# Altium schematic symbol library LATTICEPLDS_Library.SchLib: 291 symbols (part 23 of 32) (continued)
## LFEC33-F484/FN484 (continued)
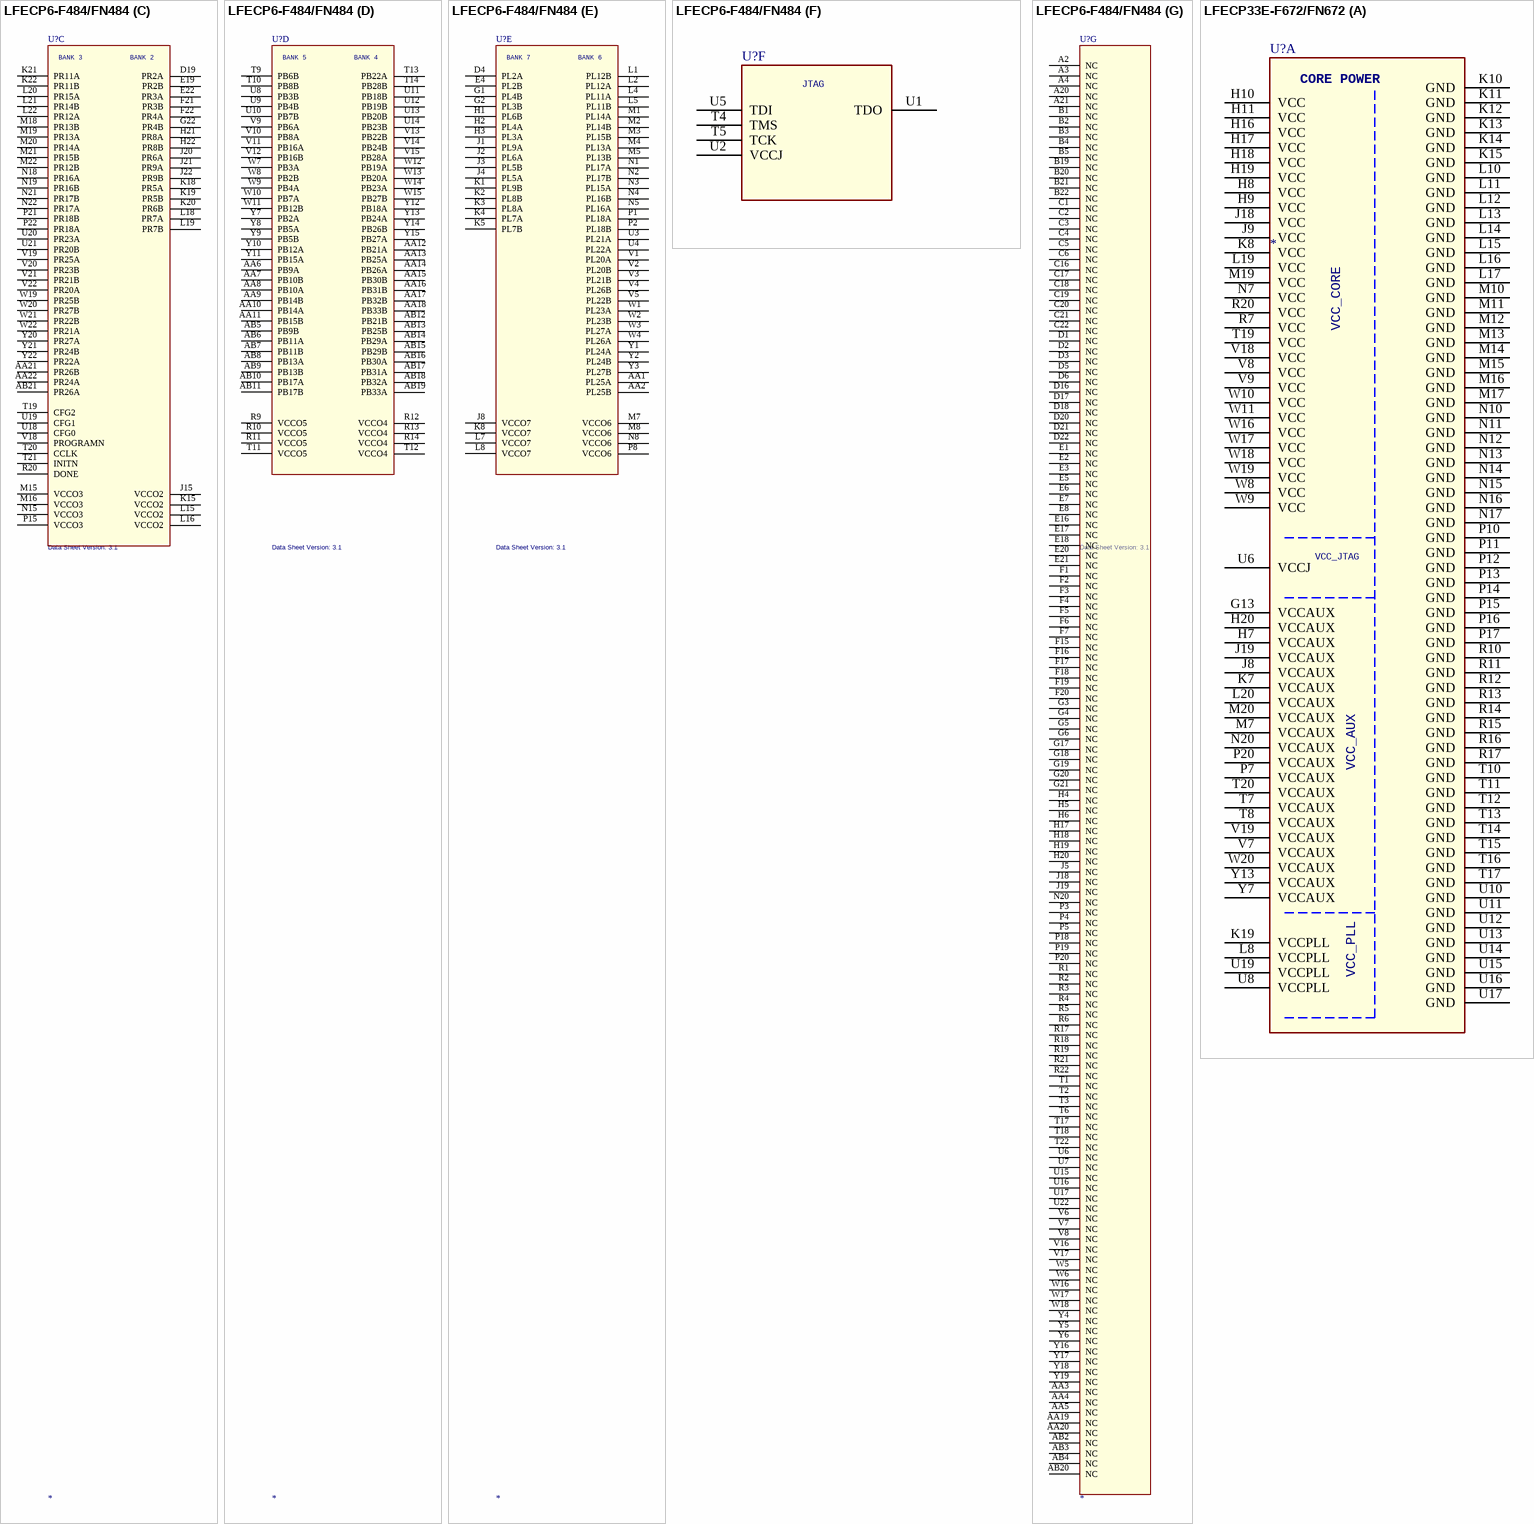
[diagram p221: symbols LFECP6-F484/FN484 to LFECP33E-F672/FN672]
part A text: BANK7; (1 of 5); BANK6; DQS Group
part B text: BANK5; (2 of 5); BANK4; DQS Group
part C text: BANK3; (3 of 5); BANK2; DQS Group
part D text: BANK1; (4 of 5); BANK0; DQS Group
part E text: (5 of 5)

## LFECP6-F484/FN484
designator U?  Data Sheet Version: 3.1
SWAP_INFO: (S1+S2+S3+S4+S5+S6); SPLIT_INST: TRUE
part A pins: A1 GND (power), A22 GND (power), AB1 GND (power), AB22 GND (power), G7 VCCAUX (power), G8 VCCAUX (power), G15 VCCAUX (power), G16 VCCAUX (power), H7 VCCAUX (power), H8 GND (power), H15 GND (power), H16 VCCAUX (power), J6 VCC (power), J7 VCC (power), J9 GND (power), J10 GND (power), J11 GND (power), J12 GND (power), J13 GND (power), J14 GND (power), J16 VCC (power), J17 VCC (power), K6 VCC (power), K7 VCC (power), K9 GND (power), K10 GND (power), K11 GND (power), K12 GND (power), K13 GND (power), K14 GND (power), K16 VCC (power), K17 VCC (power), L3 XRES, L6 VCC (power), L9 GND (power), L10 GND (power), L11 GND (power), L12 GND (power), L13 GND (power), L14 GND (power), L17 VCC (power), M6 VCC (power), M9 GND (power), M10 GND (power), M11 GND (power), M12 GND (power), M13 GND (power), M14 GND (power), M17 VCC (power), N6 VCC (power), N7 VCC (power), N9 GND (power), N10 GND (power), N11 GND (power), N12 GND (power), N13 GND (power), N14 GND (power), N16 VCC (power), N17 VCC (power), P6 VCC (power), P7 VCC (power), P9 GND (power), P10 GND (power), P11 GND (power), P12 GND (power), P13 GND (power), P14 GND (power), P16 VCC (power), P17 VCC (power), R7 VCCAUX (power), R8 GND (power), R15 GND (power), R16 VCCAUX (power), T7 VCCAUX (power), T8 VCCAUX (power), T15 VCCAUX (power), T16 VCCAUX (power)
part B pins: A5 PT9B, A6 PT11A, A7 PT11B, A8 PT13A, A9 PT13B, A10 PT17A, A11 PT17B, A12 PT21B, A13 PT25B, A14 PT29A, A15 PT29B, A16 PT30A, A17 PT31A, A18 PT32A, A19 PT33A, B6 PT9A, B7 PT10B, B8 PT10A, B9 PT14B, B10 PT14A, B11 PT15B, B12 PT21A, B13 PT25A, B14 PT26A, B15 PT30B, B16 PT31B, B17 PT32B, B18 PT33B, C7 PT2A, C8 PT5A, C9 PT5B, C10 PT12A, C11 PT15A, C12 PT18A, C13 PT24A, C14 PT26B, C15 PT27A, D7 PT3A, D8 PT2B, D9 PT4A, D10 PT7A, D11 PT12B, D12 PT19A, D13 PT20A, D14 PT23A, D15 PT27B, E9 PT6A, E10 PT8A, E11 PT16A, E12 PT16B, E13 PT22B, E14 PT24B, E15 PT28A, F8 PT3B, F9 PT4B, F10 PT7B, F11 PT18B, F12 PT19B, F13 PT20B, F14 PT23B, G9 PT6B, G10 PT8B, G11 VCCO0, G12 VCCO1, G13 PT22A, G14 PT28B, H9 VCCO0, H10 VCCO0, H11 VCCO0, H12 VCCO1, H13 VCCO1, H14 VCCO1
part C pins: AA21 PR26B, AA22 PR24A, AB21 PR26A, D19 PR2A, E19 PR2B, E22 PR3A, F21 PR3B, F22 PR4A, G22 PR4B, H21 PR8A, H22 PR8B, J15 VCCO2, J20 PR6A, J21 PR9A, J22 PR9B, K15 VCCO2, K18 PR5A, K19 PR5B, K20 PR6B, K21 PR11A, K22 PR11B, L15 VCCO2, L16 VCCO2, L18 PR7A, L19 PR7B, L20 PR15A, L21 PR14B, L22 PR12A, M15 VCCO3, M16 VCCO3, M18 PR13B, M19 PR13A, M20 PR14A, M21 PR15B, M22 PR12B, N15 VCCO3, N18 PR16A, N19 PR16B, N21 PR17B, N22 PR17A, P15 VCCO3, P21 PR18B, P22 PR18A, R20 DONE, T19 CFG2, T20 CCLK, T21 INITN, U18 CFG0, U19 CFG1, U20 PR23A, U21 PR20B, V18 PROGRAMN, V19 PR25A, V20 PR23B, V21 PR21B, V22 PR20A, W19 PR25B, W20 PR27B, W21 PR22B, W22 PR21A, Y20 PR27A, Y21 PR24B, Y22 PR22A
part D pins: AA6 PB9A, AA7 PB10B, AA8 PB10A, AA9 PB14B, AA10 PB14A, AA11 PB15B, AA12 PB21A, AA13 PB25A, AA14 PB26A, AA15 PB30B, AA16 PB31B, AA17 PB32B, AA18 PB33B, AB5 PB9B, AB6 PB11A, AB7 PB11B, AB8 PB13A, AB9 PB13B, AB10 PB17A, AB11 PB17B, AB12 PB21B, AB13 PB25B, AB14 PB29A, AB15 PB29B, AB16 PB30A, AB17 PB31A, AB18 PB32A, AB19 PB33A, R9 VCCO5, R10 VCCO5, R11 VCCO5, R12 VCCO4, R13 VCCO4, R14 VCCO4, T9 PB6B, T10 PB8B, T11 VCCO5, T12 VCCO4, T13 PB22A, T14 PB28B, U8 PB3B, U9 PB4B, U10 PB7B, U11 PB18B, U12 PB19B, U13 PB20B, U14 PB23B, V9 PB6A, V10 PB8A, V11 PB16A, V12 PB16B, V13 PB22B, V14 PB24B, V15 PB28A, W7 PB3A, W8 PB2B, W9 PB4A, W10 PB7A, W11 PB12B, W12 PB19A, W13 PB20A, W14 PB23A, W15 PB27B, Y7 PB2A, Y8 PB5A, Y9 PB5B, Y10 PB12A, Y11 PB15A, Y12 PB18A, Y13 PB24A, Y14 PB26B, Y15 PB27A
part E pins: AA1 PL25A, AA2 PL25B, D4 PL2A, E4 PL2B, G1 PL4B, G2 PL3B, H1 PL6B, H2 PL4A, H3 PL3A, J1 PL9A, J2 PL6A, J3 PL5B, J4 PL5A, J8 VCCO7, K1 PL9B, K2 PL8B, K3 PL8A, K4 PL7A, K5 PL7B, K8 VCCO7, L1 PL12B, L2 PL12A, L4 PL11A, L5 PL11B, L7 VCCO7, L8 VCCO7, M1 PL14A, M2 PL14B, M3 PL15B, M4 PL13A, M5 PL13B, M7 VCCO6, M8 VCCO6, N1 PL17A, N2 PL17B, N3 PL15A, N4 PL16B, N5 PL16A, N8 VCCO6, P1 PL18A, P2 PL18B, P8 VCCO6, U3 PL21A, U4 PL22A, V1 PL20A, V2 PL20B, V3 PL21B, V4 PL26B, V5 PL22B, W1 PL23A, W2 PL23B, W3 PL27A, W4 PL26A, Y1 PL24A, Y2 PL24B, Y3 PL27B
part F pins: T4 TMS, T5 TCK, U1 TDO, U2 VCCJ, U5 TDI
part G pins: A2 NC, A3 NC, A4 NC, A20 NC, A21 NC, AA3 NC, AA4 NC, AA5 NC, AA19 NC, AA20 NC, AB2 NC, AB3 NC, AB4 NC, AB20 NC, B1 NC, B2 NC, B3 NC, B4 NC, B5 NC, B19 NC, B20 NC, B21 NC, B22 NC, C1 NC, C2 NC, C3 NC, C4 NC, C5 NC, C6 NC, C16 NC, C17 NC, C18 NC, C19 NC, C20 NC, C21 NC, C22 NC, D1 NC, D2 NC, D3 NC, D5 NC, D6 NC, D16 NC, D17 NC, D18 NC, D20 NC, D21 NC, D22 NC, E1 NC, E2 NC, E3 NC, E5 NC, E6 NC, E7 NC, E8 NC, E16 NC, E17 NC, E18 NC, E20 NC, E21 NC, F1 NC, F2 NC, F3 NC, F4 NC, F5 NC, F6 NC, F7 NC, F15 NC, F16 NC, F17 NC, F18 NC, F19 NC, F20 NC, G3 NC, G4 NC, G5 NC, G6 NC, G17 NC, G18 NC, G19 NC, G20 NC, G21 NC, H4 NC, H5 NC, H6 NC, H17 NC, H18 NC, H19 NC, H20 NC, J5 NC, J18 NC, J19 NC, N20 NC, P3 NC, P4 NC, P5 NC, P18 NC, P19 NC, P20 NC, R1 NC, R2 NC, R3 NC, R4 NC, R5 NC, R6 NC, R17 NC, R18 NC, R19 NC, R21 NC, R22 NC, T1 NC, T2 NC, T3 NC, T6 NC, T17 NC, T18 NC, T22 NC, U6 NC, U7 NC, U15 NC, U16 NC, U17 NC, U22 NC, V6 NC, V7 NC, V8 NC, V16 NC, V17 NC, W5 NC, W6 NC, W16 NC, W17 NC, W18 NC, Y4 NC, Y5 NC, Y6 NC, Y16 NC, Y17 NC, Y18 NC, Y19 NC
part A text: SUPPLIES
part B text: BANK 1; BANK 0
part C text: BANK 3; BANK 2
part D text: BANK 5; BANK 4
part E text: BANK 7; BANK 6
part F text: JTAG

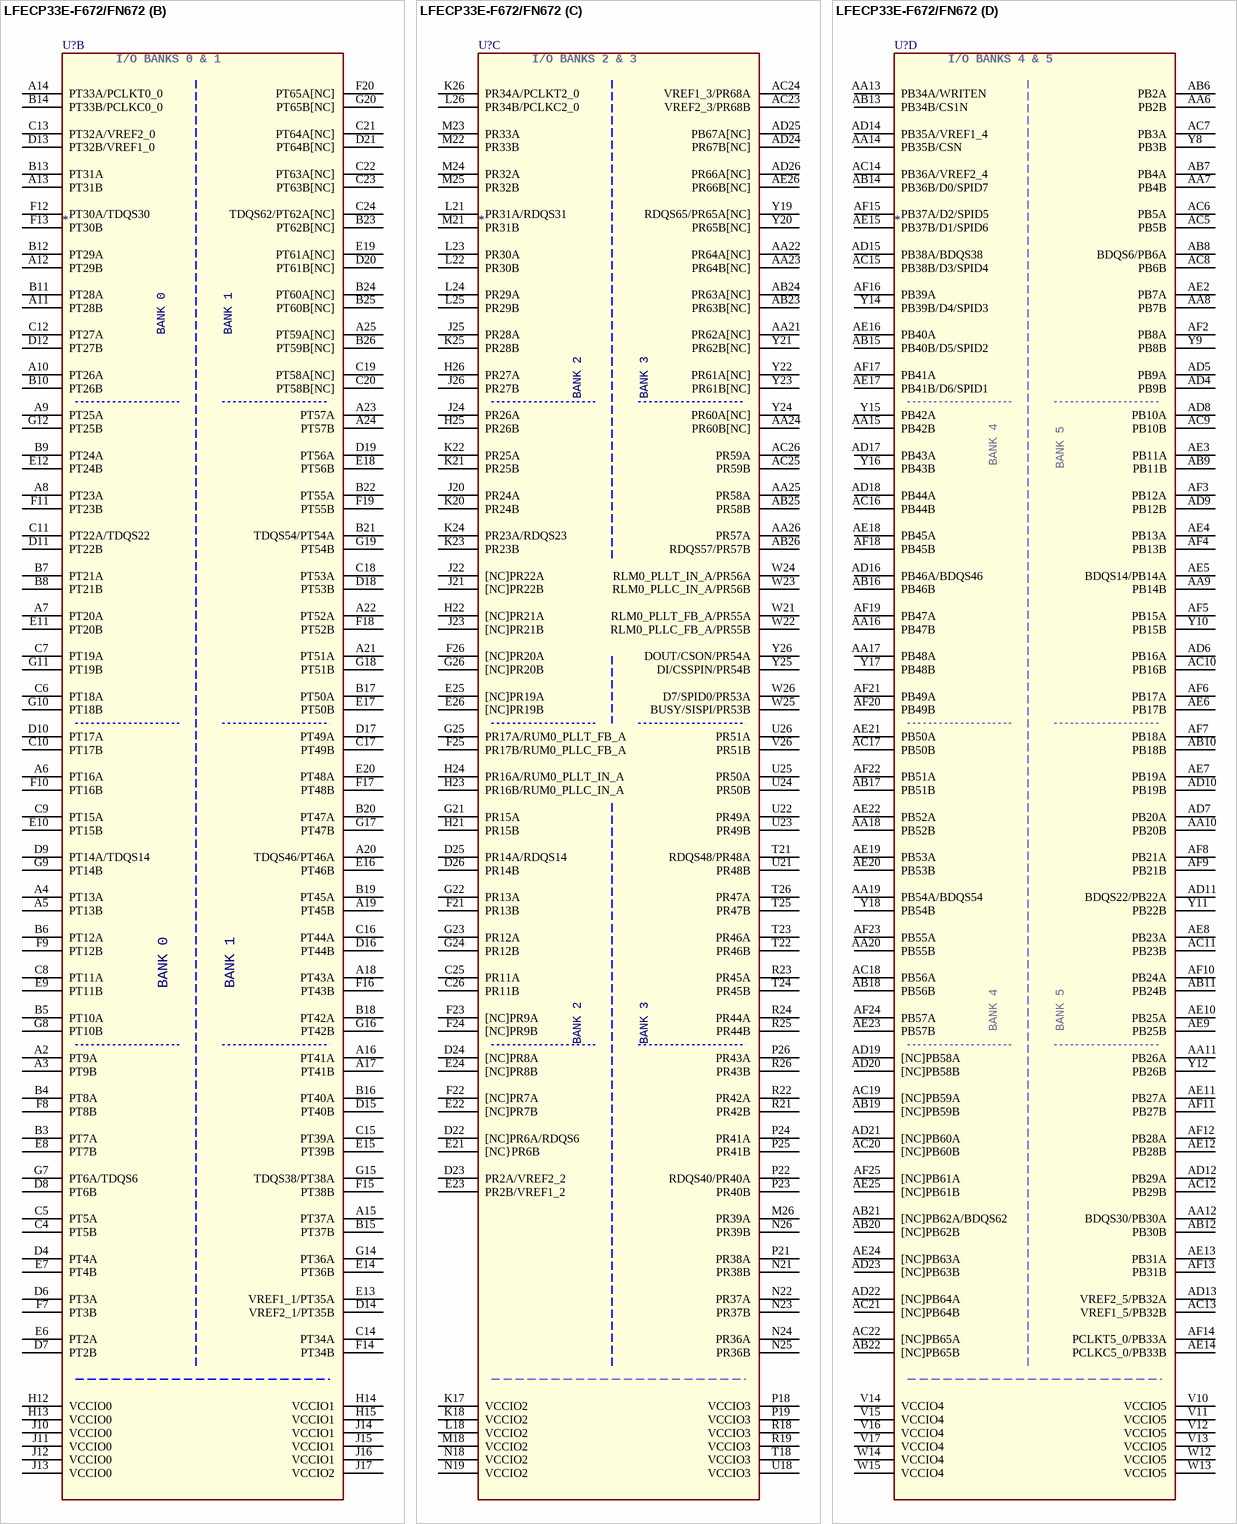
[diagram p222: symbol LFECP33E-F672/FN672]

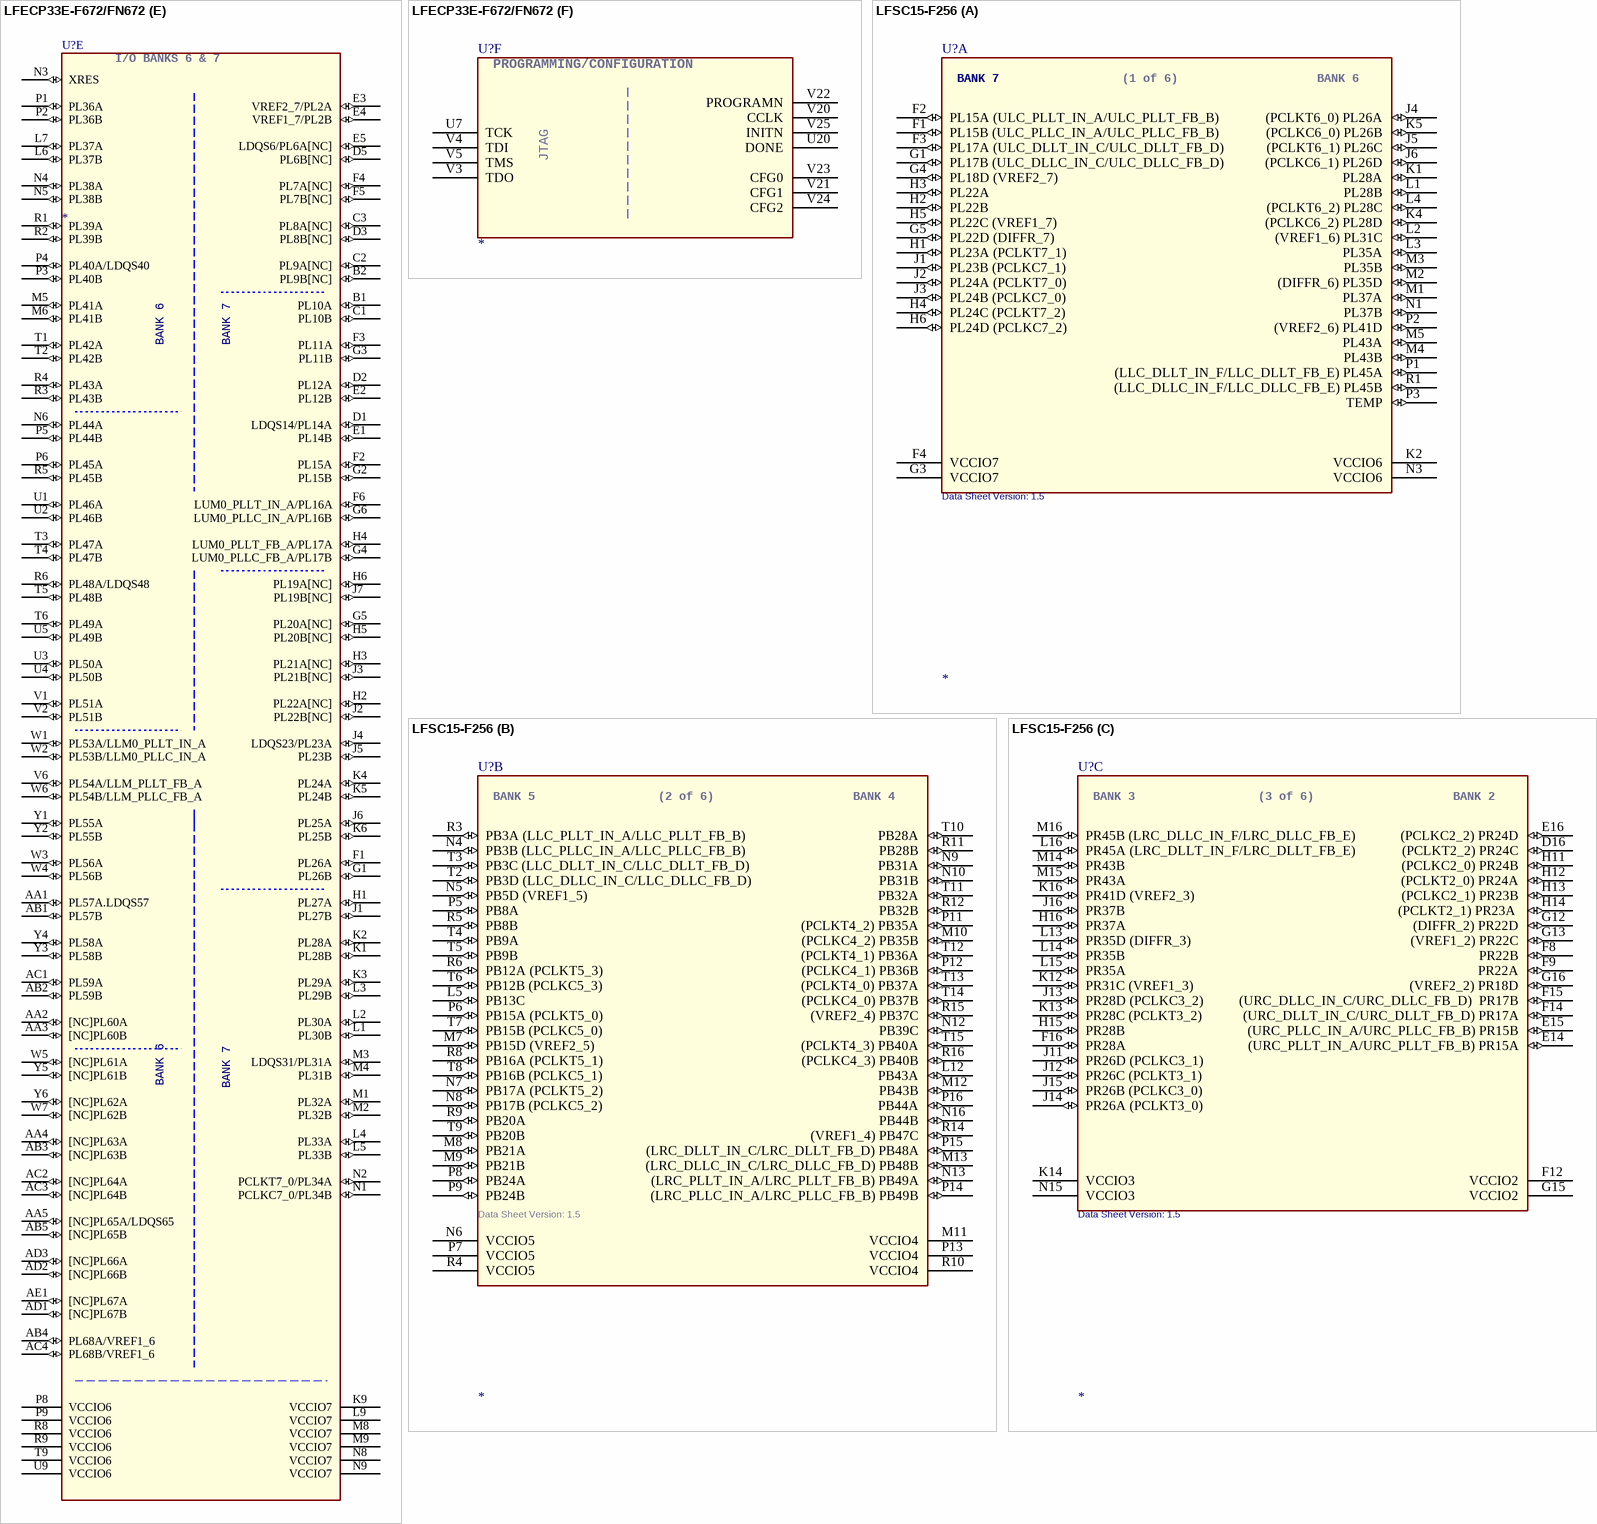
[diagram p223: symbols LFECP33E-F672/FN672 to LFSC15-F256]

## LFECP33E-F672/FN672
designator U?
part A pins: G13 VCCAUX (power), H7 VCCAUX (power), H8 VCC (power), H9 VCC (power), H10 VCC (power), H11 VCC (power), H16 VCC (power), H17 VCC (power), H18 VCC (power), H19 VCC (power), H20 VCCAUX (power), J8 VCCAUX (power), J9 VCC (power), J18 VCC (power), J19 VCCAUX (power), K7 VCCAUX (power), K8 VCC (power), K10 GND (power), K11 GND (power), K12 GND (power), K13 GND (power), K14 GND (power), K15 GND (power), K19 VCCPLL (power), L8 VCCPLL (power), L10 GND (power), L11 GND (power), L12 GND (power), L13 GND (power), L14 GND (power), L15 GND (power), L16 GND (power), L17 GND (power), L19 VCC (power), L20 VCCAUX (power), M7 VCCAUX (power), M10 GND (power), M11 GND (power), M12 GND (power), M13 GND (power), M14 GND (power), M15 GND (power), M16 GND (power), M17 GND (power), M19 VCC (power), M20 VCCAUX (power), N7 VCC (power), N10 GND (power), N11 GND (power), N12 GND (power), N13 GND (power), N14 GND (power), N15 GND (power), N16 GND (power), N17 GND (power), N20 VCCAUX (power), P7 VCCAUX (power), P10 GND (power), P11 GND (power), P12 GND (power), P13 GND (power), P14 GND (power), P15 GND (power), P16 GND (power), P17 GND (power), P20 VCCAUX (power), R7 VCC (power), R10 GND (power), R11 GND (power), R12 GND (power), R13 GND (power), R14 GND (power), R15 GND (power), R16 GND (power), R17 GND (power), R20 VCC (power), T7 VCCAUX (power), T8 VCCAUX (power), T10 GND (power), T11 GND (power), T12 GND (power), T13 GND (power), T14 GND (power), T15 GND (power), T16 GND (power), T17 GND (power), T19 VCC (power), T20 VCCAUX (power), U6 VCCJ (power), U8 VCCPLL (power), U10 GND (power), U11 GND (power), U12 GND (power), U13 GND (power), U14 GND (power), U15 GND (power), U16 GND (power), U17 GND (power), U19 VCCPLL (power), V7 VCCAUX (power), V8 VCC (power), V9 VCC (power), V18 VCC (power), V19 VCCAUX (power), W8 VCC (power), W9 VCC (power), W10 VCC (power), W11 VCC (power), W16 VCC (power), W17 VCC (power), W18 VCC (power), W19 VCC (power), W20 VCCAUX (power), Y7 VCCAUX (power), Y13 VCCAUX (power)
part B pins: A2 PT9A, A3 PT9B, A4 PT13A, A5 PT13B, A6 PT16A, A7 PT20A, A8 PT23A, A9 PT25A, A10 PT26A, A11 PT28B, A12 PT29B, A13 PT31B, A14 PT33A/PCLKT0_0, A15 PT37A, A16 PT41A, A17 PT41B, A18 PT43A, A19 PT45B, A20 TDQS46/PT46A, A21 PT51A, A22 PT52A, A23 PT57A, A24 PT57B, A25 PT59A[NC], B3 PT7A, B4 PT8A, B5 PT10A, B6 PT12A, B7 PT21A, B8 PT21B, B9 PT24A, B10 PT26B, B11 PT28A, B12 PT29A, B13 PT31A, B14 PT33B/PCLKC0_0, B15 PT37B, B16 PT40A, B17 PT50A, B18 PT42A, B19 PT45A, B20 PT47A, B21 TDQS54/PT54A, B22 PT55A, B23 PT62B[NC], B24 PT60A[NC], B25 PT60B[NC], B26 PT59B[NC], C4 PT5B, C5 PT5A, C6 PT18A, C7 PT19A, C8 PT11A, C9 PT15A, C10 PT17B, C11 PT22A/TDQS22, C12 PT27A, C13 PT32A/VREF2_0, C14 PT34A, C15 PT39A, C16 PT44A, C17 PT49B, C18 PT53A, C19 PT58A[NC], C20 PT58B[NC], C21 PT64A[NC], C22 PT63A[NC], C23 PT63B[NC], C24 TDQS62/PT62A[NC], D4 PT4A, D6 PT3A, D7 PT2B, D8 PT6B, D9 PT14A/TDQS14, D10 PT17A, D11 PT22B, D12 PT27B, D13 PT32B/VREF1_0, D14 VREF2_1/PT35B, D15 PT40B, D16 PT44B, D17 PT49A, D18 PT53B, D19 PT56A, D20 PT61B[NC], D21 PT64B[NC], E6 PT2A, E7 PT4B, E8 PT7B, E9 PT11B, E10 PT15B, E11 PT20B, E12 PT24B, E13 VREF1_1/PT35A, E14 PT36B, E15 PT39B, E16 PT46B, E17 PT50B, E18 PT56B, E19 PT61A[NC], E20 PT48A, F7 PT3B, F8 PT8B, F9 PT12B, F10 PT16B, F11 PT23B, F12 PT30A/TDQS30, F13 PT30B, F14 PT34B, F15 PT38B, F16 PT43B, F17 PT48B, F18 PT52B, F19 PT55B, F20 PT65A[NC], G7 PT6A/TDQS6, G8 PT10B, G9 PT14B, G10 PT18B, G11 PT19B, G12 PT25B, G14 PT36A, G15 TDQS38/PT38A, G16 PT42B, G17 PT47B, G18 PT51B, G19 PT54B, G20 PT65B[NC], H12 VCCIO0 (power), H13 VCCIO0 (power), H14 VCCIO1 (power), H15 VCCIO1 (power), J10 VCCIO0 (power), J11 VCCIO0 (power), J12 VCCIO0 (power), J13 VCCIO0 (power), J14 VCCIO1 (power), J15 VCCIO1 (power), J16 VCCIO1 (power), J17 VCCIO2 (power)
part C pins: AA21 PR62A[NC], AA22 PR64A[NC], AA23 PR64B[NC], AA24 PR60B[NC], AA25 PR58A, AA26 PR57A, AB23 PR63B[NC], AB24 PR63A[NC], AB25 PR58B, AB26 RDQS57/PR57B, AC23 VREF2_3/PR68B, AC24 VREF1_3/PR68A, AC25 PR59B, AC26 PR59A, AD24 PR67B[NC], AD25 PB67A[NC], AD26 PR66A[NC], AE26 PR66B[NC], C25 PR11A, C26 PR11B, D22 [NC]PR6A/RDQS6, D23 PR2A/VREF2_2, D24 [NC]PR8A, D25 PR14A/RDQS14, D26 PR14B, E21 [NC}PR6B, E22 [NC]PR7B, E23 PR2B/VREF1_2, E24 [NC]PR8B, E25 [NC]PR19A, E26 [NC]PR19B, F21 PR13B, F22 [NC]PR7A, F23 [NC]PR9A, F24 [NC]PR9B, F25 PR17B/RUM0_PLLC_FB_A, F26 [NC]PR20A, G21 PR15A, G22 PR13A, G23 PR12A, G24 PR12B, G25 PR17A/RUM0_PLLT_FB_A, G26 [NC]PR20B, H21 PR15B, H22 [NC]PR21A, H23 PR16B/RUM0_PLLC_IN_A, H24 PR16A/RUM0_PLLT_IN_A, H25 PR26B, H26 PR27A, J20 PR24A, J21 [NC]PR22B, J22 [NC]PR22A, J23 [NC]PR21B, J24 PR26A, J25 PR28A, J26 PR27B, K17 VCCIO2 (power), K18 VCCIO2 (power), K20 PR24B, K21 PR25B, K22 PR25A, K23 PR23B, K24 PR23A/RDQS23, K25 PR28B, K26 PR34A/PCLKT2_0, L18 VCCIO2 (power), L21 PR31A/RDQS31, L22 PR30B, L23 PR30A, L24 PR29A, L25 PR29B, L26 PR34B/PCLKC2_0, M18 VCCIO2 (power), M21 PR31B, M22 PR33B, M23 PR33A, M24 PR32A, M25 PR32B, M26 PR39A, N18 VCCIO2 (power), N19 VCCIO2 (power), N21 PR38B, N22 PR37A, N23 PR37B, N24 PR36A, N25 PR36B, N26 PR39B, P18 VCCIO3 (power), P19 VCCIO3 (power), P21 PR38A, P22 RDQS40/PR40A, P23 PR40B, P24 PR41A, P25 PR41B, P26 PR43A, R18 VCCIO3 (power), R19 VCCIO3 (power), R21 PR42B, R22 PR42A, R23 PR45A, R24 PR44A, R25 PR44B, R26 PR43B, T18 VCCIO3 (power), T21 RDQS48/PR48A, T22 PR46B, T23 PR46A, T24 PR45B, T25 PR47B, T26 PR47A, U18 VCCIO3 (power), U21 PR48B, U22 PR49A, U23 PR49B, U24 PR50B, U25 PR50A, U26 PR51A, V26 PR51B, W21 RLM0_PLLT_FB_A/PR55A, W22 RLM0_PLLC_FB_A/PR55B, W23 RLM0_PLLC_IN_A/PR56B, W24 RLM0_PLLT_IN_A/PR56A, W25 BUSY/SISPI/PR53B, W26 D7/SPID0/PR53A, Y19 RDQS65/PR65A[NC], Y20 PR65B[NC], Y21 PR62B[NC], Y22 PR61A[NC], Y23 PR61B[NC], Y24 PR60A[NC], Y25 DI/CSSPIN/PR54B, Y26 DOUT/CSON/PR54A
part D pins: AA6 PB2B, AA7 PB4B, AA8 PB7B, AA9 PB14B, AA10 PB20B, AA11 PB26A, AA12 BDQS30/PB30A, AA13 PB34A/WRITEN, AA14 PB35B/CSN, AA15 PB42B, AA16 PB47B, AA17 PB48A, AA18 PB52B, AA19 PB54A/BDQS54, AA20 PB55B, AB6 PB2A, AB7 PB4A, AB8 BDQS6/PB6A, AB9 PB11B, AB10 PB18B, AB11 PB24B, AB12 PB30B, AB13 PB34B/CS1N, AB14 PB36B/D0/SPID7, AB15 PB40B/D5/SPID2, AB16 PB46B, AB17 PB51B, AB18 PB56B, AB19 [NC]PB59B, AB20 [NC]PB62B, AB21 [NC]PB62A/BDQS62, AB22 [NC]PB65B, AC5 PB5B, AC6 PB5A, AC7 PB3A, AC8 PB6B, AC9 PB10B, AC10 PB16B, AC11 PB23B, AC12 PB29B, AC13 VREF1_5/PB32B, AC14 PB36A/VREF2_4, AC15 PB38B/D3/SPID4, AC16 PB44B, AC17 PB50B, AC18 PB56A, AC19 [NC]PB59A, AC20 [NC]PB60B, AC21 [NC]PB64B, AC22 [NC]PB65A, AD4 PB9B, AD5 PB9A, AD6 PB16A, AD7 PB20A, AD8 PB10A, AD9 PB12B, AD10 PB19B, AD11 BDQS22/PB22A, AD12 PB29A, AD13 VREF2_5/PB32A, AD14 PB35A/VREF1_4, AD15 PB38A/BDQS38, AD16 PB46A/BDQS46, AD17 PB43A, AD18 PB44A, AD19 [NC]PB58A, AD20 [NC]PB58B, AD21 [NC]PB60A, AD22 [NC]PB64A, AD23 [NC]PB63B, AE2 PB7A, AE3 PB11A, AE4 PB13A, AE5 BDQS14/PB14A, AE6 PB17B, AE7 PB19A, AE8 PB23A, AE9 PB25B, AE10 PB25A, AE11 PB27A, AE12 PB28B, AE13 PB31A, AE14 PCLKC5_0/PB33B, AE15 PB37B/D1/SPID6, AE16 PB40A, AE17 PB41B/D6/SPID1, AE18 PB45A, AE19 PB53A, AE20 PB53B, AE21 PB50A, AE22 PB52A, AE23 PB57B, AE24 [NC]PB63A, AE25 [NC]PB61B, AF2 PB8A, AF3 PB12A, AF4 PB13B, AF5 PB15A, AF6 PB17A, AF7 PB18A, AF8 PB21A, AF9 PB21B, AF10 PB24A, AF11 PB27B, AF12 PB28A, AF13 PB31B, AF14 PCLKT5_0/PB33A, AF15 PB37A/D2/SPID5, AF16 PB39A, AF17 PB41A, AF18 PB45B, AF19 PB47A, AF20 PB49B, AF21 PB49A, AF22 PB51A, AF23 PB55A, AF24 PB57A, AF25 [NC]PB61A, V10 VCCIO5 (power), V11 VCCIO5 (power), V12 VCCIO5 (power), V13 VCCIO5 (power), V14 VCCIO4 (power), V15 VCCIO4 (power), V16 VCCIO4 (power), V17 VCCIO4 (power), W12 VCCIO5 (power), W13 VCCIO5 (power), W14 VCCIO4 (power), W15 VCCIO4 (power), Y8 PB3B, Y9 PB8B, Y10 PB15B, Y11 PB22B, Y12 PB26B, Y14 PB39B/D4/SPID3, Y15 PB42A, Y16 PB43B, Y17 PB48B, Y18 PB54B
part E pins: AA1 PL57A.LDQS57 (io), AA2 [NC]PL60A (io), AA3 [NC]PL60B (io), AA4 [NC]PL63A (io), AA5 [NC]PL65A/LDQS65 (io), AB1 PL57B (io), AB2 PL59B (io), AB3 [NC]PL63B (io), AB4 PL68A/VREF1_6 (io), AB5 [NC]PL65B (io), AC1 PL59A (io), AC2 [NC]PL64A (io), AC3 [NC]PL64B (io), AC4 PL68B/VREF1_6 (io), AD1 [NC]PL67B (io), AD2 [NC]PL66B (io), AD3 [NC]PL66A (io), AE1 [NC]PL67A (io), B1 PL10A (io), B2 PL9B[NC] (io), C1 PL10B (io), C2 PL9A[NC] (io), C3 PL8A[NC] (io), D1 LDQS14/PL14A (io), D2 PL12A (io), D3 PL8B[NC] (io), D5 PL6B[NC] (io), E1 PL14B (io), E2 PL12B (io), E3 VREF2_7/PL2A (io), E4 VREF1_7/PL2B (io), E5 LDQS6/PL6A[NC] (io), F1 PL26A (io), F2 PL15A (io), F3 PL11A (io), F4 PL7A[NC] (io), F5 PL7B[NC] (io), F6 LUM0_PLLT_IN_A/PL16A (io), G1 PL26B (io), G2 PL15B (io), G3 PL11B (io), G4 LUM0_PLLC_FB_A/PL17B (io), G5 PL20A[NC] (io), G6 LUM0_PLLC_IN_A/PL16B (io), H1 PL27A (io), H2 PL22A[NC] (io), H3 PL21A[NC] (io), H4 LUM0_PLLT_FB_A/PL17A (io), H5 PL20B[NC] (io), H6 PL19A[NC] (io), J1 PL27B (io), J2 PL22B[NC] (io), J3 PL21B[NC] (io), J4 LDQS23/PL23A (io), J5 PL23B (io), J6 PL25A (io), J7 PL19B[NC] (io), K1 PL28B (io), K2 PL28A (io), K3 PL29A (io), K4 PL24A (io), K5 PL24B (io), K6 PL25B (io), K9 VCCIO7 (power), L1 PL30B (io), L2 PL30A (io), L3 PL29B (io), L4 PL33A (io), L5 PL33B (io), L6 PL37B (io), L7 PL37A (io), L9 VCCIO7 (power), M1 PL32A (io), M2 PL32B (io), M3 LDQS31/PL31A (io), M4 PL31B (io), M5 PL41A (io), M6 PL41B (io), M8 VCCIO7 (power), M9 VCCIO7 (power), N1 PCLKC7_0/PL34B (io), N2 PCLKT7_0/PL34A (io), N3 XRES (io), N4 PL38A (io), N5 PL38B (io), N6 PL44A (io), N8 VCCIO7 (power), N9 VCCIO7 (power), P1 PL36A (io), P2 PL36B (io), P3 PL40B (io), P4 PL40A/LDQS40 (io), P5 PL44B (io), P6 PL45A (io), P8 VCCIO6 (power), P9 VCCIO6 (power), R1 PL39A (io), R2 PL39B (io), R3 PL43B (io), R4 PL43A (io), R5 PL45B (io), R6 PL48A/LDQS48 (io), R8 VCCIO6 (power), R9 VCCIO6 (power), T1 PL42A (io), T2 PL42B (io), T3 PL47A (io), T4 PL47B (io), T5 PL48B (io), T6 PL49A (io), T9 VCCIO6 (power), U1 PL46A (io), U2 PL46B (io), U3 PL50A (io), U4 PL50B (io), U5 PL49B (io), U9 VCCIO6 (power), V1 PL51A (io), V2 PL51B (io), V6 PL54A/LLM_PLLT_FB_A (io), W1 PL53A/LLM0_PLLT_IN_A (io), W2 PL53B/LLM0_PLLC_IN_A (io), W3 PL56A (io), W4 PL56B (io), W5 [NC]PL61A (io), W6 PL54B/LLM_PLLC_FB_A (io), W7 [NC]PL62B (io), Y1 PL55A (io), Y2 PL55B (io), Y3 PL58B (io), Y4 PL58A (io), Y5 [NC]PL61B (io), Y6 [NC]PL62A (io)